# Altium footprint library LUMI_Handy_Soldering_LIB.PcbLib: 562 footprints (part 22 of 36)
Each footprint in its own frame and in the unit in brackets; x right, y up, seen from the top. Pads: shape width x height; smd on the part's side, far side on the other; paste and mask are expansions set on the pad; w line width, h text height; cw(c..) or ccw(c..) is an arc to the next point about the centre after c.
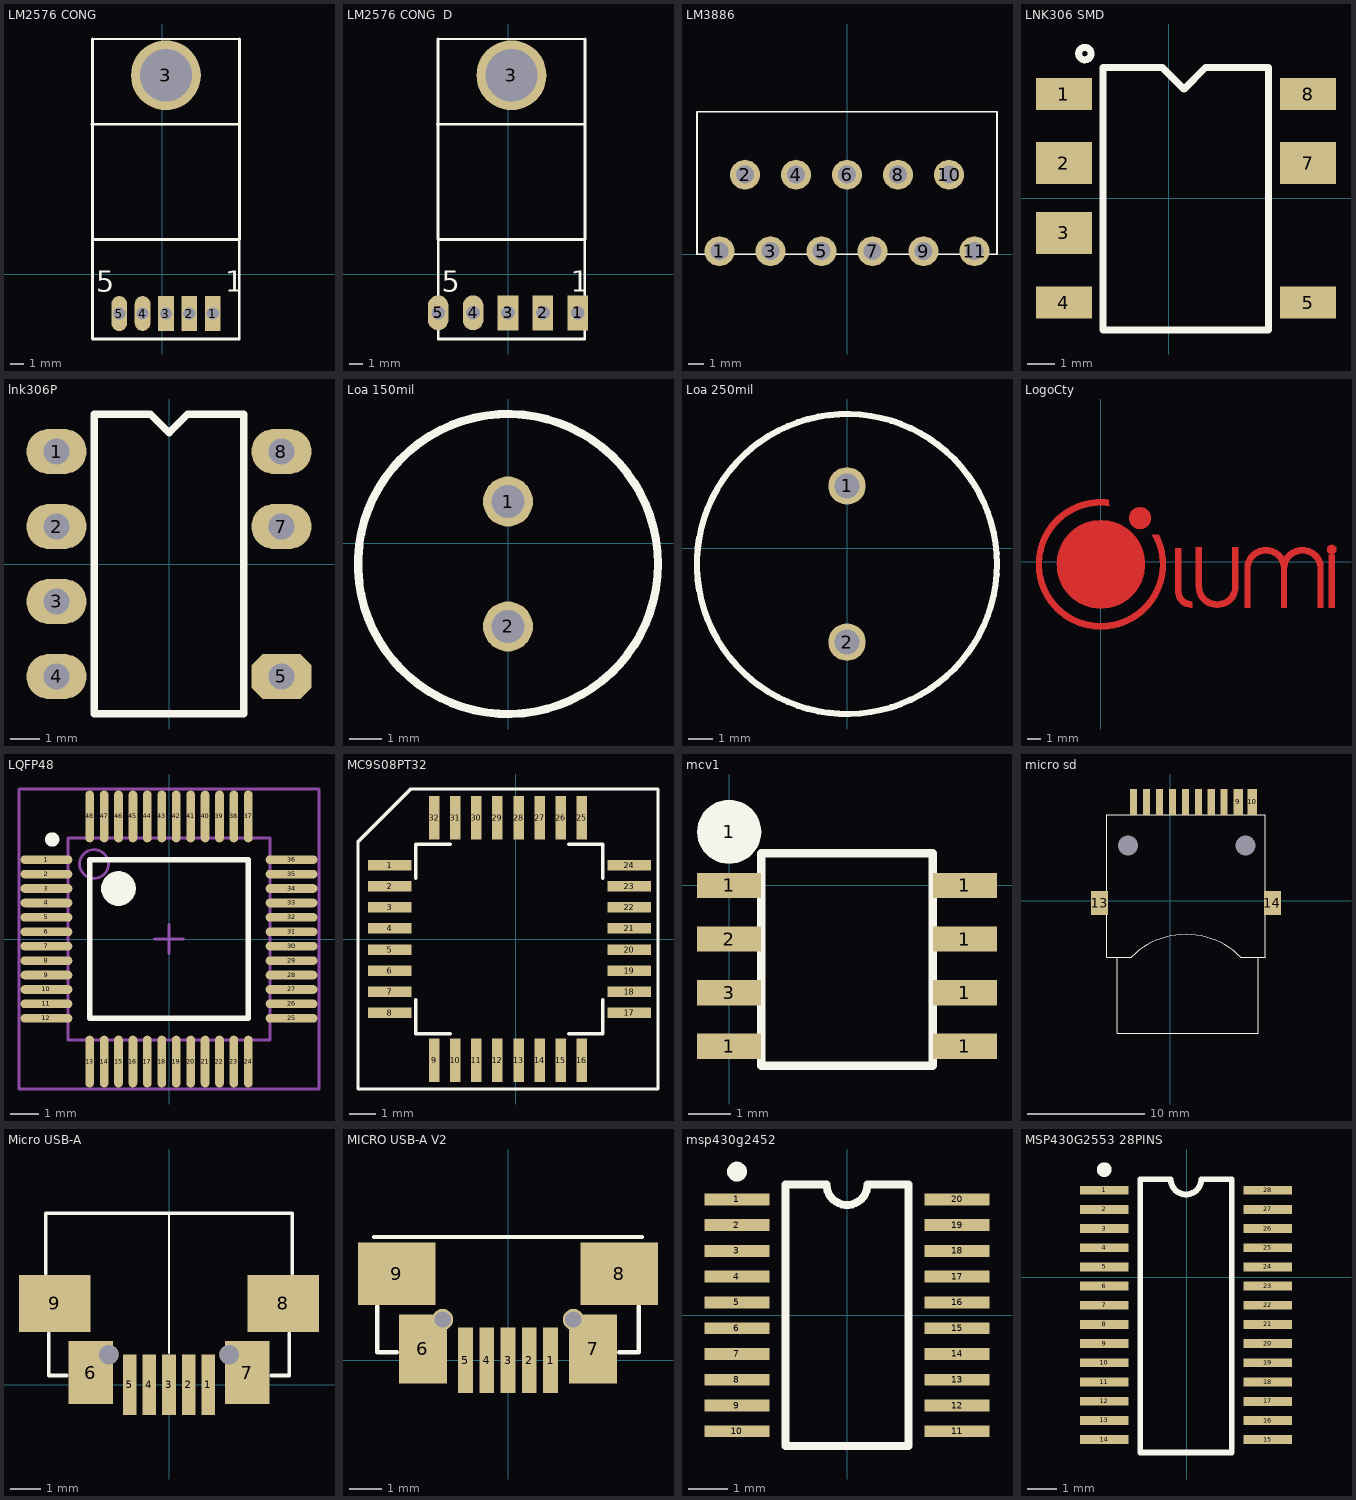
[diagram p21: the footprints below, top view; thin cyan lines are the x and y axes]

## LM2576 CONG [mil]
pads (6):
  rect 45x100 hole 35: 1(143.86,-112.17) 2(77,-112) 3(10,-112.17)
  round 200 hole 150: 3(10,570)
  oval 45x100 hole 35: 4(-57,-112)
  oval 45x100 hole 35 paste+0: 5(-123.86,-112.17)
Top Overlay:
  lines w7: -200.63,674 220.63,674
  lines w7.87: -201.63,429.8 219.63,429.8 ; -200.63,674 -200.63,100 220,100 220,-185 -200,-185 -200,100 ; 161.73,100 220.63,100 220.63,674
  text "1" at 180,-50 h59.06
  text "5" at -190,-50 h59.06
3D body: height 218.39, standoff -194.78, extent -191.12,-121 208.96,673.01

## LM2576 CONG  D [mm]
pads (6):
  rect 1.5x2.54 hole 1: 1(5.08,-2.794) 2(2.54,-2.794) 3(0,-2.794)
  round 5.08 hole 3.81: 3(0.254,14.478)
  oval 1.5x2.54 hole 1: 4(-2.54,-2.794)
  oval 1.5x2.54 hole 1 paste+0: 5(-5.08,-2.794)
Top Overlay:
  lines w0.178: -5.096,17.12 5.604,17.12
  lines w0.2: -5.121,10.917 5.579,10.917 ; -5.096,17.12 -5.096,2.54 5.588,2.54 5.588,-4.699 -5.08,-4.699 -5.08,2.54 ; 4.108,2.54 5.604,2.54 5.604,17.12
  text "5" at -4.826,-1.27 h1.5
  text "1" at 4.572,-1.27 h1.5
3D body: height 5.55, standoff -4.95, extent -4.854,-3.073 5.308,17.094

## LM3886 [mm]
pads (11):
  round 2 hole 1.2: 1(-8.5,0.2) 2(-6.8,5.3) 3(-5.1,0.2) 4(-3.4,5.3) 5(-1.7,0.2) 6(0,5.3) 7(1.7,0.2) 8(3.4,5.3) 9(5.1,0.2) 10(6.8,5.3) 11(8.5,0.2)
Top Overlay:
  lines w0.102: -10,0 10,0 10,9.5 -10,9.5 -10,0
3D body: height 20.79, standoff -4, extent -10.008,0 10.008,9.576

## LNK306 SMD [mil]
pads (7):
  rect 80x46 smd: 1(-150,149) 4(-150,-150) 5(200,-150) 8(200,149)
  rect 80x60 smd: 2(-150,50) 3(-150,-50) 7(200,50)
Top Overlay:
  circle w10: c-119.94,207 r8.94
  lines w10: -94,-189 143,-189 143,187 53,187 22,156 -9,187 -94,187 -94,-189
3D body: height 157.48, standoff 0, extent -166.91,-194.8 218.91,193

## lnk306P [mil]
pads (7):
  oval 80x60 hole 35: 1(-150,150) 2(-150,50) 3(-150,-50) 4(-150,-150) 7(150,50) 8(150,150)
  oct 80x60 hole 35: 5(150,-150)
Top Overlay:
  lines w10: -100,-200 -100,200 -25,200 0,175 25,200 100,200 100,-200 -100,-200
3D body: height 200.39, standoff -137.8, extent -154.92,-209.95 154.93,219.97

## Loa 150mil [mil]
pads (2):
  round 60 hole 40: 1(0,50) 2(0,-100)
Top Overlay:
  circle w10: c0,-25 r180.07
3D body: height 177.17, standoff -177.17, extent -178.16,-201.16 176.17,153.17

## Loa 250mil [mil]
pads (2):
  round 60 hole 40: 1(0,100) 2(0,-150)
Top Overlay:
  circle w10: c0,-25 r240.05
3D body: height 216.54, standoff -216.54, extent -236.22,-261.21 236.22,211.23

## LogoCty [mm]
Top Layer:
  drawing of 2184 lines, arcs and shapes, not listed

## LQFP48 [mm] "Thin QFP, 48-Leads, Body 7x7mm, Pitch 0.5mm, IPC Medium Density"
height 1.6
pads (48):
  oval 1.8x0.3 smd: 1(-4.25,2.75) 2(-4.25,2.25) 3(-4.25,1.75) 4(-4.25,1.25) 5(-4.25,0.75) 6(-4.25,0.25) 7(-4.25,-0.25) 8(-4.25,-0.75) 9(-4.25,-1.25) 10(-4.25,-1.75) 11(-4.25,-2.25) 12(-4.25,-2.75) 25(4.25,-2.75) 26(4.25,-2.25) 27(4.25,-1.75) 28(4.25,-1.25) 29(4.25,-0.75) 30(4.25,-0.25) 31(4.25,0.25) 32(4.25,0.75) 33(4.25,1.25) 34(4.25,1.75) 35(4.25,2.25) 36(4.25,2.75)
  oval 0.3x1.8 smd: 13(-2.75,-4.25) 14(-2.25,-4.25) 15(-1.75,-4.25) 16(-1.25,-4.25) 17(-0.75,-4.25) 18(-0.25,-4.25) 19(0.25,-4.25) 20(0.75,-4.25) 21(1.25,-4.25) 22(1.75,-4.25) 23(2.25,-4.25) 24(2.75,-4.25) 37(2.75,4.25) 38(2.25,4.25) 39(1.75,4.25) 40(1.25,4.25) 41(0.75,4.25) 42(0.25,4.25) 43(-0.25,4.25) 44(-0.75,4.25) 45(-1.25,4.25) 46(-1.75,4.25) 47(-2.25,4.25) 48(-2.75,4.25)
Top Overlay:
  circle w0.25: c-4.05,3.45 r0.125
  circle w0.6: c-1.75,1.75 r0.3
  lines w0.2: -2.75,-2.75 -2.75,2.75 2.75,2.75 2.75,-2.75 -2.75,-2.75
Mechanical 13:
  circle w0.1: c-2.6,2.6 r0.5
  lines w0.1: -3.5,-3.5 -3.5,3.5 3.5,3.5 3.5,-3.5 -3.5,-3.5
Mechanical 15:
  lines w0.1: -0.5,0 0.5,0 ; 0,-0.5 0,0.5 ; -5.2,-5.2 -5.2,5.2 5.2,5.2 5.2,-5.2 -5.2,-5.2
3D body: height 1.5, standoff 0, extent -4.5,-4.5 4.5,4.5

## MC9S08PT32 [mm]
pads (32):
  rect 1.65x0.4 smd: 1(-4.8,2.8) 2(-4.8,2) 3(-4.8,1.2) 4(-4.8,0.4) 5(-4.8,-0.4) 6(-4.8,-1.2) 7(-4.8,-2) 8(-4.8,-2.8) 17(4.3,-2.8) 18(4.3,-2) 19(4.3,-1.2) 20(4.3,-0.4) 21(4.3,0.4) 22(4.3,1.2) 23(4.3,2) 24(4.3,2.8)
  rect 0.4x1.65 smd: 9(-3.1,-4.6) 10(-2.3,-4.6) 11(-1.5,-4.6) 12(-0.7,-4.6) 13(0.1,-4.6) 14(0.9,-4.6) 15(1.7,-4.6) 16(2.5,-4.6) 25(2.5,4.6) 26(1.7,4.6) 27(0.9,4.6) 28(0.1,4.6) 29(-0.7,4.6) 30(-1.5,4.6) 31(-2.3,4.6) 32(-3.1,4.6)
Top Overlay:
  lines w0.127: -3.8,-2.3 -3.8,-3.6 -2.5,-3.6 ; -3.8,2.3 -3.8,3.6 -2.5,3.6 ; 2,-3.6 3.3,-3.6 3.3,-2.3 ; 2,3.6 3.3,3.6 3.3,2.3 ; -6,-5.7 5.4,-5.7 5.4,5.7 -4,5.7 -6,3.7 -6,3 -6,-5.7
3D body: height 1.5, standoff 0.02, extent -4.8,-4.5 4.2,4.5

## mcv1 [mm]
pads (9):
  rect 1.52x0.6 smd: 1(0,-3.81) 1(0,0) 1(5.588,-3.81) 1(5.588,-2.54) 1(5.588,-1.27) 1(5.588,0) 2(0,-1.27) 3(0,-2.54)
  round 1.524 on Top Overlay: 1(0,1.27)
Top Overlay:
  lines w0.2: 0.762,-4.278 4.826,-4.278 4.826,0.762 0.762,0.762 0.762,-4.278
3D body: height 1.75, standoff 0, extent -0.306,-4.4 5.706,0.6

## micro sd [mm]
pads (14):
  rect 0.6x2.2 smd: 1(4.6,8.4) 2(3.5,8.4) 3(2.4,8.4) 4(1.3,8.4) 5(0.2,8.4) 6(-0.9,8.4) 7(-2,8.4) 8(-3.1,8.4)
  rect 0.8x2.2 smd: 9(5.8,8.4) 10(7,8.4)
  round 0 hole 1.7: 11(6.4,4.7) 12(-3.6,4.7)
  rect 1.45x2 smd: 13(-6,-0.2) 14(8.7,-0.2)
Top Overlay:
  lines w0.1: -4.5,-4.8 -4.5,-11.3 7.5,-11.3 7.5,-4.8 ; -3.5,4.4 -3.2,4.7 ; -5.4,-4.8 -3.3,-4.8 cw(c1.35,-9.45) 6,-4.8 8.1,-4.8 8.1,7.3 -5.4,7.3 -5.4,-4.8
3D body: height 2.05, standoff 0.07, extent -6.6,-7.45 9.5,9.6

## Micro USB-A [mm] "USB A connector, 4pin, For USB sing"
height 2.54
pads (11):
  rect 0.45x2 smd: 1(1.3,0) 2(0.65,0) 3(0,0) 4(-0.65,0) 5(-1.3,0)
  rect 1.475x2.1 smd: 6(-2.6,0.4) 7(2.6,0.4)
  rect 2.375x1.9 smd: 8(3.8,2.7) 9(-3.8,2.7)
  round 0.65 hole 0.65: ""(-2,1) ""(2,1)
Top Overlay:
  lines w0.076: 0,1.05 0,5.7
  lines w0.127: -4.1,3.7 -4.1,5.7 4.1,5.7 4.1,3.7 ; -4,1.7 -4,0.3 -3.4,0.3 ; 3.4,0.3 4,0.3 4,1.7
3D body: height 2.67, standoff -0.27, extent -3.99,0.25 3.99,5.68

## MICRO USB-A V2 [mm]
pads (11):
  rect 0.45x2 smd: 1(1.3,0) 2(0.65,0) 3(0,0) 4(-0.65,0) 5(-1.3,0)
  rect 1.475x2.1 smd: 6(-2.6,0.35) 7(2.6,0.35)
  rect 2.375x1.9 smd: 8(3.4,2.65) 9(-3.4,2.65)
  round 0.65 hole 0.5: ""(-2,1.25) ""(2,1.25)
Top Overlay:
  lines w0.127: -4.1,3.775 4.1,3.775 ; -4,1.65 -4,0.25 -3.4,0.25 ; 3.4,0.25 4,0.25 4,1.65
3D body: height 2.67, standoff -0.27, extent -3.99,0.2 3.99,5.63

## msp430g2452 [mm]
pads (20):
  rect 1.65x0.3 smd: 1(-2.775,2.925) 2(-2.775,2.275) 3(-2.775,1.625) 4(-2.775,0.975) 5(-2.775,0.325) 6(-2.775,-0.325) 7(-2.775,-0.975) 8(-2.775,-1.625) 9(-2.775,-2.275) 10(-2.775,-2.925) 11(2.775,-2.925) 12(2.775,-2.275) 13(2.775,-1.625) 14(2.775,-0.975) 15(2.775,-0.325) 16(2.775,0.325) 17(2.775,0.975) 18(2.775,1.625) 19(2.775,2.275) 20(2.775,2.925)
Top Overlay:
  circle w0.25: c-2.775,3.625 r0.125
  lines w0.2: -1.55,-3.3 1.55,-3.3 1.55,3.3 0.517,3.3 cw(c0,3.3) -0.517,3.3 -1.55,3.3 -1.55,-3.3
3D body: height -0.41, standoff -1.61, extent -3.275,-3.3 3.275,3.3

## MSP430G2553 28PINS [mm]
pads (28):
  rect 1.65x0.3 smd: 1(-2.8,2.95) 2(-2.8,2.3) 3(-2.8,1.65) 4(-2.8,1) 5(-2.8,0.35) 6(-2.8,-0.3) 7(-2.8,-0.95) 8(-2.8,-1.6) 9(-2.8,-2.25) 10(-2.8,-2.9) 11(-2.8,-3.552) 12(-2.8,-4.202) 13(-2.8,-4.852) 14(-2.8,-5.502) 15(2.75,-5.507) 16(2.75,-4.857) 17(2.75,-4.207) 18(2.75,-3.557) 19(2.75,-2.9) 20(2.75,-2.25) 21(2.75,-1.6) 22(2.75,-0.95) 23(2.75,-0.3) 24(2.75,0.35) 25(2.75,1) 26(2.75,1.65) 27(2.75,2.3) 28(2.75,2.95)
Top Overlay:
  circle w0.25: c-2.8,3.65 r0.125
  lines w0.2: -1.575,-5.944 -1.575,3.325 -0.542,3.325 ccw(c-0.025,3.325) 0.491,3.325 1.525,3.325 1.525,-5.944 -1.575,-5.944
3D body: height -0.34, standoff -1.33, extent -3.302,-6.12 3.098,3.58